# Altium footprint library TomvanRijn-PCB.PcbLib: 165 footprints (part 6 of 11)
Each footprint in its own frame and in the unit in brackets; x right, y up, seen from the top. Pads: shape width x height; smd on the part's side, far side on the other; paste and mask are expansions set on the pad; w line width, h text height; cw(c..) or ccw(c..) is an arc to the next point about the centre after c.
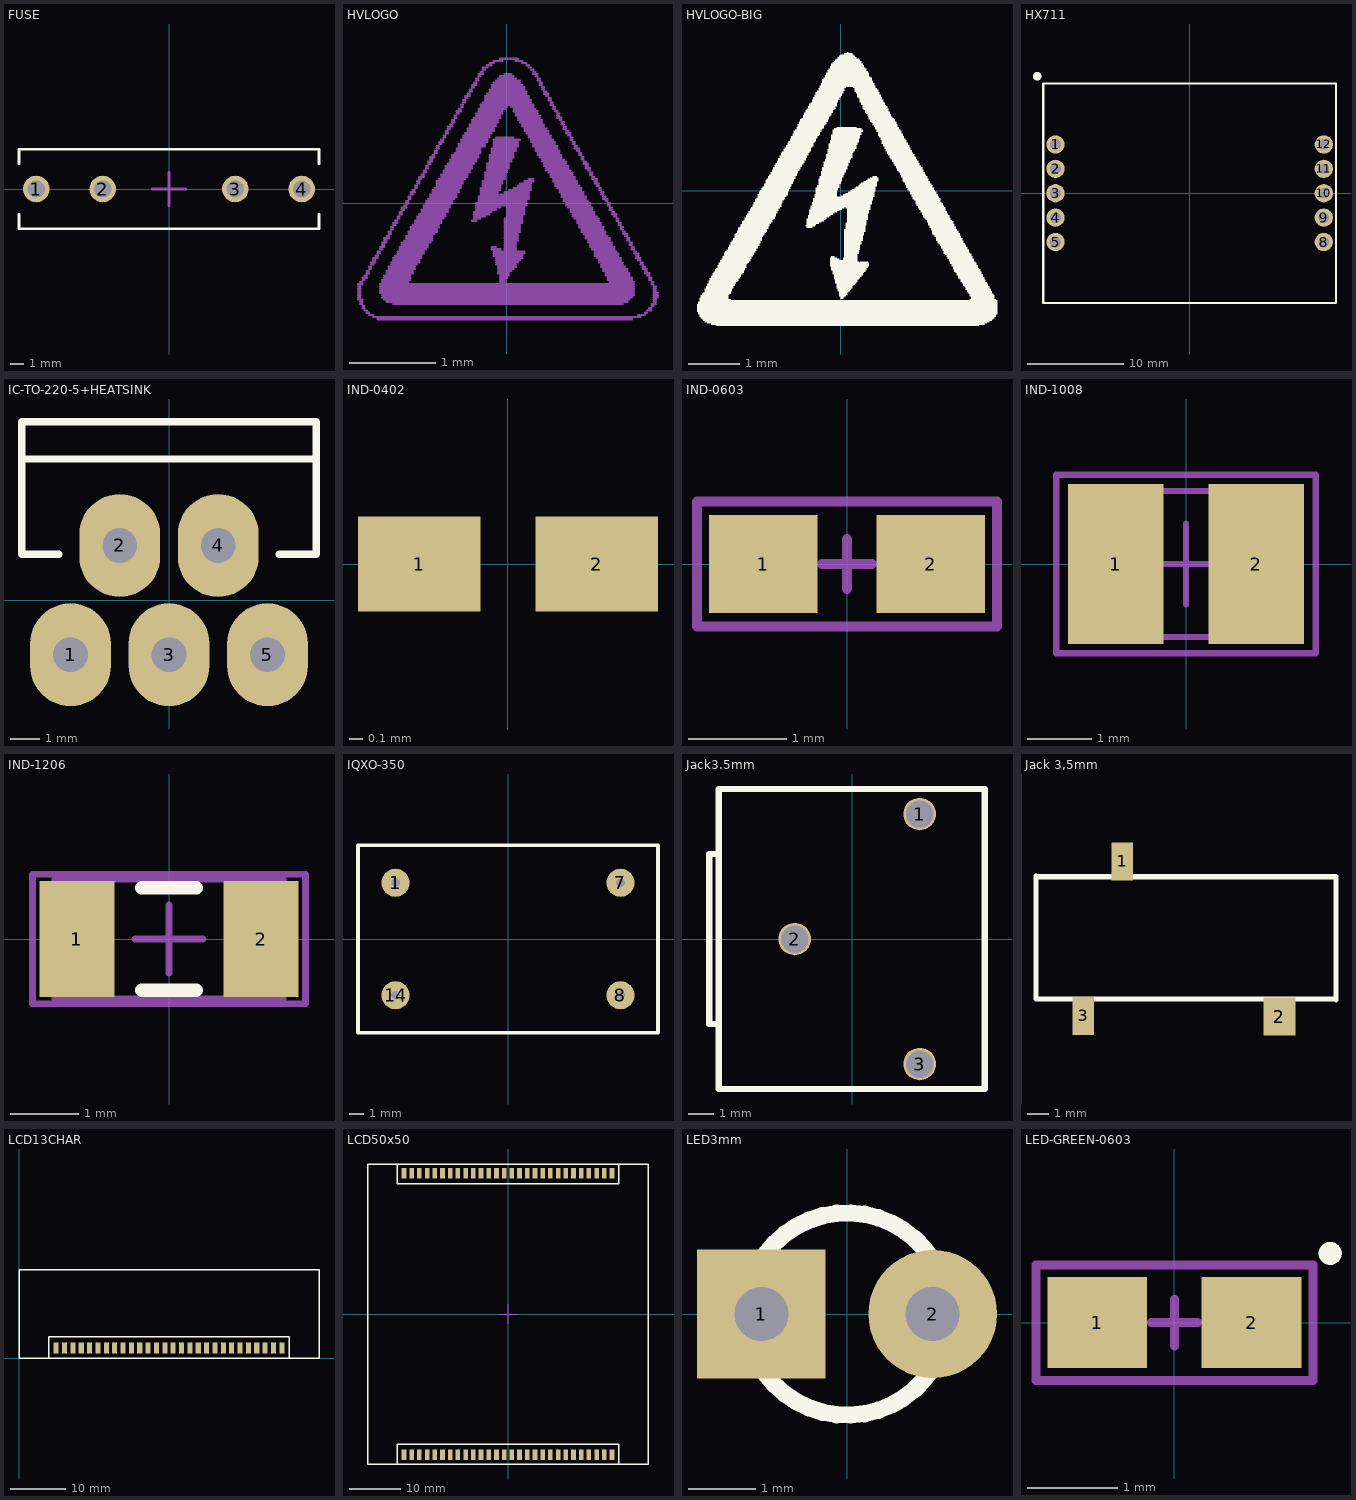
[diagram p5: the footprints below, top view; thin cyan lines are the x and y axes]

## FUSE [mm] "Fuse Holder, standard 20 mm x 5 mm fuses"
height 10
pads (4):
  round 2 hole 1.3: 1(-10,0) 2(-5,0) 3(5,0) 4(10,0)
Top Overlay:
  lines w0.203: -11.303,-1.905 -11.3,-1.908 -11.3,-3 11.3,-3 11.3,-1.908 11.303,-1.905 ; -11.303,1.905 -11.3,1.908 -11.3,3 11.3,3 11.3,1.908 11.303,1.905
Mechanical 15:
  lines w0.203: -1.27,0 1.27,0 ; 0,-1.27 0,1.27
3D body "fuse.step": height 10.59, standoff -2.31, extent -10.617,-3.077 10.661,3.114

## HVLOGO [mm] "Logo, High Voltage"
Bottom Overlay:
  drawing of 508 lines, arcs and shapes, not listed

## HVLOGO-BIG [mm] "High Voltage Warning Logo"
Top Overlay:
  drawing of 547 lines, arcs and shapes, not listed

## HX711 [mm] "24-bit ADC from Sparkfun"
pads (10):
  round 1.905 hole 1.1: 1(-13.97,5.08) 2(-13.97,2.54) 3(-13.97,0) 4(-13.97,-2.54) 5(-13.97,-5.08) 8(13.97,-5.08) 9(13.97,-2.54) 10(13.97,0) 11(13.97,2.54) 12(13.97,5.08)
Top Overlay:
  circle w0.635: c-15.875,12.192 r0.127
  lines w0.254: -15.24,-11.43 15.24,-11.43 15.24,11.43 -15.24,11.43 -15.24,-11.43
3D body "SparkFun_HX711_Load_Cell.step": height 7, standoff 5.41, extent -15.24,-11.43 15.24,11.43
3D body "CircuitWorks-HEADER 2_54 VERTICAL 5X.step": height 8.75, standoff -2.25, extent -15.22,-6.35 -12.72,6.35
3D body "CircuitWorks-HEADER 2_54 VERTICAL 5X.step": height 8.75, standoff -2.25, extent 12.72,-6.35 15.22,6.35

## IC-TO-220-5+HEATSINK [mil] "TO-220, 5 leads"
height 590.55
pads (5):
  oval 110x140 hole 47.24: 1(-133.86,-74.21) 2(-66.93,74.21) 3(0,-74.21) 4(66.93,74.21) 5(133.86,-74.21)
Top Overlay:
  lines w10: -199.99,192.41 -199.4,191.82 200,191.82 ; -150,62.4 -200,62.4 -199.99,242.33 200.01,242.33 200.01,62.4 150,62.4
3D body "SW3dPS-TO220-5.STEP": height 826.38, standoff -118.11, extent -199.99,-82.08 200.01,242.33
3D body "User Library-HS201-20.STEP": height 987.4, standoff 200, extent -464.59,-23.48 460.61,567.07

## IND-0402 [mm] "Inductor, SMD, 0402"
height 0.508
pads (2):
  rect 0.9x0.7 smd: 1(-0.65,0) 2(0.65,0)
3D body "0402-ind.step": height 0.6, standoff 0, extent -0.5,-0.25 0.5,0.25

## IND-0603 [mm] "SMD inductor, 0603"
height 2.413
pads (2):
  rect 1.1x1 smd: 1(-0.85,0) 2(0.85,0)
Mechanical 15:
  lines w0.1: -0.254,0 0.254,0 ; 0,-0.254 0,0.254 ; -1.524,-0.635 1.524,-0.635 1.524,0.635 -1.524,0.635 -1.524,-0.635
3D body "0603-ind.step": height 0.95, standoff 0, extent -0.8,-0.4 0.8,0.4

## IND-1008 [mm] "SMD Inductor, 1008"
height 2
pads (2):
  rect 1.5x2.5 smd: 1(-1.1,0) 2(1.1,0)
Mechanical 13:
  lines w0.1: -1.397,-1.143 1.397,-1.143 1.397,1.143 -1.397,1.143 -1.397,-1.143
Mechanical 15:
  lines w0.1: -0.635,0 0.635,0 ; 0,-0.635 0,0.635 ; -2.032,-1.397 2.032,-1.397 2.032,1.397 -2.032,1.397 -2.032,-1.397
3D body "Coilcraft-1008HT-DEFAULT.step": height 1.13, standoff -0.01, extent -1.345,-1.165 1.345,1.165

## IND-1206 [mm] "SMD inductor, 1206"
height 0.635
pads (2):
  rect 1.1x1.7 smd: 1(-1.35,0) 2(1.35,0)
Top Overlay:
  lines w0.2: -0.4,-0.75 0.4,-0.75 ; -0.4,0.75 0.4,0.75
Mechanical 13:
  lines w0.1: -1.675,-0.875 1.675,-0.875 1.675,0.875 -1.675,0.875 -1.675,-0.875
Mechanical 15:
  lines w0.1: -0.5,0 0.5,0 ; 0,-0.5 0,0.5 ; -2,-0.95 2,-0.95 2,0.95 -2,0.95 -2,-0.95
3D body "1206-ind.step": height 1.81, standoff -0.4, extent -1.651,-0.8 1.677,0.8

## IQXO-350 [mm] "Oscillator"
pads (4):
  round 1.905 hole 0.6: 1(-7.62,3.81) 7(7.62,3.81) 8(7.62,-3.81) 14(-7.62,-3.81)
Top Overlay:
  lines w0.254: -10.16,-6.35 -10.16,6.35 10.16,6.35 10.16,-6.35 -10.16,-6.35
3D body "User Library-ocs-1.step": height 5.41, standoff -5.79, extent -10.125,-6.3 10.125,6.3

## Jack3.5mm [mm]
pads (3):
  round 1.3 hole 1.1: 1(2.7,5) 2(-2.3,0) 3(2.7,-5)
Top Overlay:
  lines w0.254: -5.432,-3.4 -5.715,-3.4 -5.715,3.4 -5.363,3.4 ; -5.334,6 -5.334,-6 5.266,-6 ; -5.3,6 5.3,6 5.3,-6
3D body "User Library-CONNECTOR, PHONE JACK, STEREO, 3_5 MM, SEE-PLUS ST-3536-02HG.step": height 10.51, standoff -2.99, extent -8.766,-6 5.334,6

## Jack 3,5mm [mm] "Stereo jack 3,5mm, smt, Tom van Rijn"
pads (5):
  rect 1.016x1.778 smd: 1(4.775,-5.175) 3(2.925,-12.475)
  round 1.524 on Drill Drawing: 2(10.975,-8.85) 3(3.975,-8.85)
  rect 1.524x1.778 smd: 2(12.2,-12.5)
Top Overlay:
  lines w0.254: 0.7,-11.675 14.875,-11.675 ; 0.7,-11.65 0.7,-5.875 ; 0.725,-5.9 14.875,-5.9 14.875,-11.7
3D body "sj-3523-smt.stp": height 0.27, standoff -5.53, extent -2,-13.35 15,-4.35

## LCD13CHAR [mm] "LCD display, 13 characters"
height 0.178
pads (28):
  rect 0.9x2 smd paste-25.4: 1(47.174,1.81) 2(45.674,1.81) 3(44.174,1.81) 4(42.674,1.81) 5(41.174,1.81) 6(39.674,1.81) 7(38.174,1.81) 8(36.674,1.81) 9(35.174,1.81) 10(33.674,1.81) 11(32.174,1.81) 12(30.674,1.81) 13(29.174,1.81) 14(27.674,1.81) 15(26.174,1.81) 16(24.674,1.81) 17(23.174,1.81) 18(21.674,1.81) 19(20.174,1.81) 20(18.674,1.81) 21(17.174,1.81) 22(15.674,1.81) 23(14.174,1.81) 24(12.674,1.81) 25(11.174,1.81) 26(9.674,1.81) 27(8.174,1.81) 28(6.674,1.81)
Top Overlay:
  lines w0.254: 5.334,0 5.334,3.81 48.514,3.81 48.514,0 ; 0,0 53.848,0 53.848,15.875 0,15.875 0,0
3D body: height 4.35, standoff 3.5, extent 0,2.795 53.704,15.748
3D body: height 5, standoff 4.3, extent 0.001,0.699 53.848,15.812
3D body: height 3.55, standoff 3.45, extent 0,2.795 53.704,15.748
3D body: height 4.35, standoff 0, extent 6.224,0.763 47.624,2.793

## LCD50x50 [mm] "LCD Screen, 56 leads, 0.9 mm x 2 mm pads, 1.5 mm pitch, 54.8 mm row spacing"
height 5
pads (56):
  rect 0.9x2 smd paste-25.4: 1(-20.25,27.4) 2(-18.75,27.4) 3(-17.25,27.4) 4(-15.75,27.4) 5(-14.25,27.4) 6(-12.75,27.4) 7(-11.25,27.4) 8(-9.75,27.4) 9(-8.25,27.4) 10(-6.75,27.4) 11(-5.25,27.4) 12(-3.75,27.4) 13(-2.25,27.4) 14(-0.75,27.4) 15(0.75,27.4) 16(2.25,27.4) 17(3.75,27.4) 18(5.25,27.4) 19(6.75,27.4) 20(8.25,27.4) 21(9.75,27.4) 22(11.25,27.4) 23(12.75,27.4) 24(14.25,27.4) 25(15.75,27.4) 26(17.25,27.4) 27(18.75,27.4) 28(20.25,27.4) 29(-20.25,-27.4) 30(-18.75,-27.4) 31(-17.25,-27.4) 32(-15.75,-27.4) 33(-14.25,-27.4) 34(-12.75,-27.4) 35(-11.25,-27.4) 36(-9.75,-27.4) 37(-8.25,-27.4) 38(-6.75,-27.4) 39(-5.25,-27.4) 40(-3.75,-27.4) 41(-2.25,-27.4) 42(-0.75,-27.4) 43(0.75,-27.4) 44(2.25,-27.4) 45(3.75,-27.4) 46(5.25,-27.4) 47(6.75,-27.4) 48(8.25,-27.4) 49(9.75,-27.4) 50(11.25,-27.4) 51(12.75,-27.4) 52(14.25,-27.4) 53(15.75,-27.4) 54(17.25,-27.4) 55(18.75,-27.4) 56(20.25,-27.4)
Top Overlay:
  lines w0.254: -21.59,-29.21 -21.59,-25.4 21.59,-25.4 21.59,-29.21 ; -21.59,29.21 -21.59,25.4 21.59,25.4 21.59,29.21 ; -27.305,-29.21 27.305,-29.21 27.305,29.21 -27.305,29.21 -27.305,-29.21
Mechanical 15:
  lines w0.203: -1.905,0 1.905,0 ; 0,-1.905 0,1.905
3D body: height 4.35, standoff 3.5, extent -26.399,-26.415 26.399,26.415
3D body: height 5, standoff 4.3, extent -26.527,-28.575 26.527,28.575
3D body: height 3.55, standoff 3.45, extent -26.399,-26.415 26.399,26.415
3D body: height 4.35, standoff 0, extent -20.7,26.417 20.7,28.447
3D body: height 4.35, standoff 0, extent -20.7,-28.447 20.7,-26.417

## LED3mm [mm] "LED, through hole, 100 mil pitch, 3mm diameter"
height 5
pads (2):
  rect 1.905x1.905 hole 0.8: 1(-1.27,0)
  round 1.905 hole 0.8: 2(1.27,0)
Top Overlay:
  circle w0.254: c0,0 r1.5
3D body "SW3dPS-LEDd3G.STEP": height 5.51, standoff -2.49, extent -1.664,-1.648 1.636,1.64

## LED-GREEN-0603 [mm] "SMD LED, Green, 0603"
height 1.143
pads (2):
  rect 1.1x1 smd: 1(-0.85,0) 2(0.85,0)
Top Overlay:
  circle w0.127: c1.714,0.762 r0.064
Mechanical 15:
  lines w0.1: -0.254,0 0.254,0 ; 0,-0.254 0,0.254 ; -1.524,-0.635 -1.524,0.635 1.524,0.635 1.524,-0.635 -1.524,-0.635
3D body "User Library-led0603_GRE.step": height 1.1, standoff 0, extent -0.81,-0.4 0.81,0.4